# Altium footprint library dcdc_ldo_ref.pcblib: 40 footprints (part 3 of 3)
Each footprint in its own frame and in the unit in brackets; x right, y up, seen from the top. Pads: shape width x height; smd on the part's side, far side on the other; paste and mask are expansions set on the pad; w line width, h text height; cw(c..) or ccw(c..) is an arc to the next point about the centre after c.
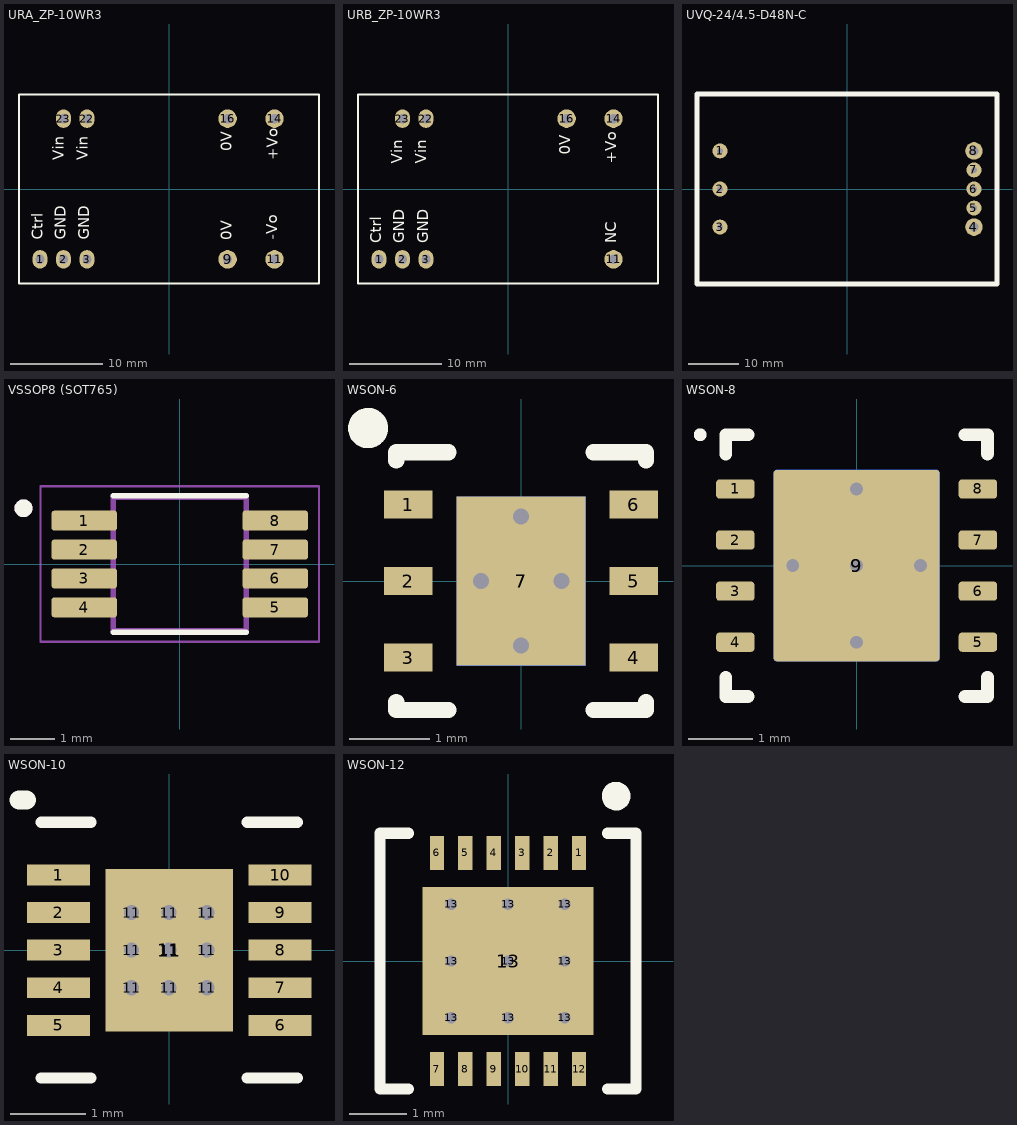
[diagram p2: the footprints below, top view; thin cyan lines are the x and y axes]

## URA_ZP-10WR3 [mm] "dc-dc converter"
pads (9):
  oval 1.6x2 hole 1: 1(-13.97,-7.62) 2(-11.43,-7.62) 3(-8.89,-7.62) 22(-8.89,7.62) 23(-11.43,7.62)
  round 2 hole 1: 9(6.35,-7.62) 11(11.43,-7.62) 14(11.43,7.62) 16(6.35,7.62)
Top Overlay:
  lines w0.2: -16.25,-10.25 -16.25,10.25 16.25,10.25 16.25,-10.25 -16.25,-10.25
  text "0V" at 7.223,-5.525 h2
  text "Ctrl" at -13.271,-5.52 h2
  text "GND" at -10.774,-5.52 h2
  text "GND" at -8.18,-5.52 h2
  text "-Vo" at 12.178,-5.522 h2
  text "+Vo" at 12.218,3.105 h2
  text "0V" at 7.225,4.09 h2
  text "Vin" at -8.374,3.105 h2
  text "Vin" at -10.968,3.105 h2
3D body "URA_ZP-10WR3_2.stp": height 10.81, standoff -3.79, extent -16,-10.025 16,10.025

## URB_ZP-10WR3 [mm] "dc-dc converter"
pads (8):
  oval 1.6x2 hole 1: 1(-13.97,-7.62) 2(-11.43,-7.62) 3(-8.89,-7.62) 22(-8.89,7.62) 23(-11.43,7.62)
  round 2 hole 1: 11(11.43,-7.62) 14(11.43,7.62) 16(6.35,7.62)
Top Overlay:
  lines w0.2: -16.25,-10.25 16.25,-10.25 16.25,10.25 -16.25,10.25 -16.25,-10.25
  text "Ctrl" at -13.305,-5.901 h2
  text "GND" at -10.808,-5.901 h2
  text "GND" at -8.214,-5.901 h2
  text "NC" at 12.144,-5.903 h2
  text "+Vo" at 12.183,2.724 h2
  text "0V" at 7.191,3.709 h2
  text "Vin" at -8.408,2.724 h2
  text "Vin" at -11.002,2.724 h2
3D body "URB_ZP-10WR3.stp": height 3.35, standoff -11.25, extent -16,-10.025 16,10.025

## UVQ-24/4.5-D48N-C [mm]
pads (8):
  round 3 hole 1.2 paste+0 mask+0: 1(-25.4,7.62) 2(-25.4,0) 3(-25.4,-7.62) 5(25.4,-3.81) 6(25.4,0) 7(25.4,3.81)
  round 3.5 hole 1.8 paste+0 mask+0: 4(25.4,-7.62) 8(25.4,7.62)
Top Overlay:
  lines w1: -30,-19 -30,19 30,19 30,-19 -30,-19
3D body "uvq_48_2.5_d24_a.step": height 11.27, standoff -5.37, extent -29.22,-18.44 29.2,18.39

## VSSOP8 (SOT765) [mm]
pads (8):
  rrect25% 1.47x0.45 smd: 1(-2.15,0.975) 2(-2.15,0.325) 3(-2.15,-0.325) 4(-2.15,-0.975) 5(2.15,-0.975) 6(2.15,-0.325) 7(2.15,0.325) 8(2.15,0.975)
Top Overlay:
  circle w0.2: c-3.52,1.255 r0.1
  lines w0.127: -1.5,-1.535 1.5,-1.535 ; -1.5,1.535 1.5,1.535
Plata3D:
  circle w0.2: c-3.52,1.255 r0.1
  lines w0.127: -1.5,-1.5 1.5,-1.5 1.5,1.5 -1.5,1.5 -1.5,-1.5
Board3D:
  lines w0.05: -3.135,-1.75 3.135,-1.75 3.135,1.75 -3.135,1.75 -3.135,-1.75
3D body "LM5009AMM_NOPB.STEP": height 1.1, standoff 0, extent -2.45,-1.5 2.45,1.5

## WSON-6 [mm] "TI wson"
pads (8):
  rect 0.6x0.35 smd paste-0.175 mask+0.051: 1(-1.4,0.95) 2(-1.4,0) 3(-1.4,-0.95) 4(1.4,-0.95) 5(1.4,0) 6(1.4,0.95)
  rect 1.6x2.1 smd paste-0.8 mask+0.051: 7(0,0)
  rect 1.6x2.1 smd far side paste-0.8 mask+0.051: 7(0,0)
via 0,-0.8 diameter 0.5 hole 0.2
via 0.5,0 diameter 0.5 hole 0.2
via 0,0.8 diameter 0.5 hole 0.2
via -0.5,0 diameter 0.5 hole 0.2
Top Overlay:
  circle w0.25: c-1.9,1.9 r0.125
  lines w0.2: -1.55,-1.5 -1.55,-1.6 -0.9,-1.6 ; -1.55,1.5 -1.55,1.6 -0.9,1.6 ; 0.9,-1.6 1.55,-1.6 1.55,-1.5 ; 0.9,1.6 1.55,1.6 1.55,1.5
3D body "User Library-WSON-6.step": height 0.75, standoff 0, extent -1.51,-1.49 1.51,1.51

## WSON-8 [mm] "WSON-8"
height 0.8
pads (10):
  rrect33% 0.6x0.3 smd: 1(-1.9,1.2) 2(-1.9,0.4) 3(-1.9,-0.4) 4(-1.9,-1.2) 5(1.9,-1.2) 6(1.9,-0.4) 7(1.9,0.4) 8(1.9,1.2)
  rrect4% 2.6x3 smd paste-1.3: 9(0,0)
  rrect4% 2.6x3 smd far side paste-1.3: 9(0,0)
via 0,-1.2 diameter 0.5 hole 0.2
via 1,0 diameter 0.5 hole 0.2
via 0,0 diameter 0.5 hole 0.2
via -1,0 diameter 0.5 hole 0.2
via 0,1.2 diameter 0.5 hole 0.2
Top Overlay:
  circle w0.1: c-2.45,2.05 r0.05
  lines w0.2: -2.05,-1.75 -2.05,-2.05 -1.7,-2.05 ; -2.05,1.75 -2.05,2.05 -1.7,2.05 ; 1.7,-2.05 2.05,-2.05 2.05,-1.75 ; 1.7,2.05 2.05,2.05 2.05,1.75
Top Paste:
  rectangle: 0.1,0.1 1.248,1.41
  rectangle: -1.248,0.1 -0.1,1.41
  rectangle: -1.248,-1.41 -0.1,-0.1
  rectangle: 0.1,-1.41 1.248,-0.1
3D body "NGT0008A.stp": height 0.81, standoff 0.01, extent -2,-2 2,2

## WSON-10 [mm] "wson10"
height 0.8
pads (20):
  rect 0.838x0.279 smd mask-25.4: 1(-1.475,1) 2(-1.475,0.5) 3(-1.475,0) 4(-1.475,-0.5) 5(-1.475,-1) 6(1.475,-1) 7(1.475,-0.5) 8(1.475,0) 9(1.475,0.5) 10(1.475,1)
  round 0.3 hole 0.2 mask+0: 11(-0.5,-0.5) 11(-0.5,0) 11(-0.5,0.5) 11(0,-0.5) 11(0,0) 11(0,0.5) 11(0.5,-0.5) 11(0.5,0) 11(0.5,0.5)
  rect 1.702x2.159 smd mask-25.4: 11(0,0)
Top Overlay:
  lines w0.152: -1.702,-1.702 -1.041,-1.702 ; -1.702,1.702 -1.041,1.702 ; 1.041,-1.702 1.702,-1.702 ; 1.041,1.702 1.702,1.702
  lines w0.254: -2,2 -1.9,2
Top Solder:
  region: -1.994,0.76 -0.956,0.76 -0.956,1.24 -1.994,1.24
  region: -1.994,0.26 -0.956,0.26 -0.956,0.74 -1.994,0.74
  region: -1.994,-0.24 -0.956,-0.24 -0.956,0.24 -1.994,0.24
  region: -1.994,-0.74 -0.956,-0.74 -0.956,-0.26 -1.994,-0.26
  region: -1.994,-1.24 -0.956,-1.24 -0.956,-0.76 -1.994,-0.76
  region: 0.956,-1.24 1.994,-1.24 1.994,-0.76 0.956,-0.76
  region: 0.956,-0.74 1.994,-0.74 1.994,-0.26 0.956,-0.26
  region: 0.956,-0.24 1.994,-0.24 1.994,0.24 0.956,0.24
  region: 0.956,0.26 1.994,0.26 1.994,0.74 0.956,0.74
  region: 0.956,0.76 1.994,0.76 1.994,1.24 0.956,1.24
  region: -0.951,-1.179 0.951,-1.179 0.951,1.179 -0.951,1.179
Board:
  lines w0.127: -0.203,-0.406 cw(c-0.394,-0.406) -0.584,-0.406 cw(c-0.394,-0.394) -0.203,-0.38 ; 0.584,-0.406 cw(c0.394,-0.406) 0.203,-0.406 cw(c0.394,-0.394) 0.584,-0.38 ; -0.584,0.38 ccw(c-0.394,0.394) -0.203,0.407 ccw(c-0.394,0.394) -0.584,0.38 ; 0.203,0.38 ccw(c0.394,0.394) 0.584,0.407 ccw(c0.394,0.394) 0.203,0.38
3D body "User Library-SON10_3x3x0_8mm.step": height 0.8, standoff 0, extent -1.501,-1.501 1.501,1.501

## WSON-12 [mm] "WSON-12"
height 0.8
pads (22):
  rect 0.25x0.6 smd: 1(1.25,1.9) 2(0.75,1.9) 3(0.25,1.9) 4(-0.25,1.9) 5(-0.75,1.9) 6(-1.25,1.9) 7(-1.25,-1.9) 8(-0.75,-1.9) 9(-0.25,-1.9) 10(0.25,-1.9) 11(0.75,-1.9) 12(1.25,-1.9)
  round 0.3 hole 0.2 mask+0: 13(-1,-1) 13(-1,0) 13(-1,1) 13(0,-1) 13(0,0) 13(0,1) 13(1,-1) 13(1,0) 13(1,1)
  rect 3x2.6 smd: 13(0,0)
Top Overlay:
  circle w0.254: c1.9,2.9 r0.125
  lines w0.2: -1.75,-2.25 -2.25,-2.25 -2.25,2.25 -1.75,2.25 ; 1.75,-2.25 2.25,-2.25 2.25,2.25 1.75,2.25
3D body "User Library-LP39798-2.step": height 0.8, standoff 0, extent -2,-2 2,2